# Altium footprint library CONNECTOR.PcbLib: 169 footprints (part 10 of 11)
Each footprint in its own frame and in the unit in brackets; x right, y up, seen from the top. Pads: shape width x height; smd on the part's side, far side on the other; paste and mask are expansions set on the pad; w line width, h text height; cw(c..) or ccw(c..) is an arc to the next point about the centre after c.
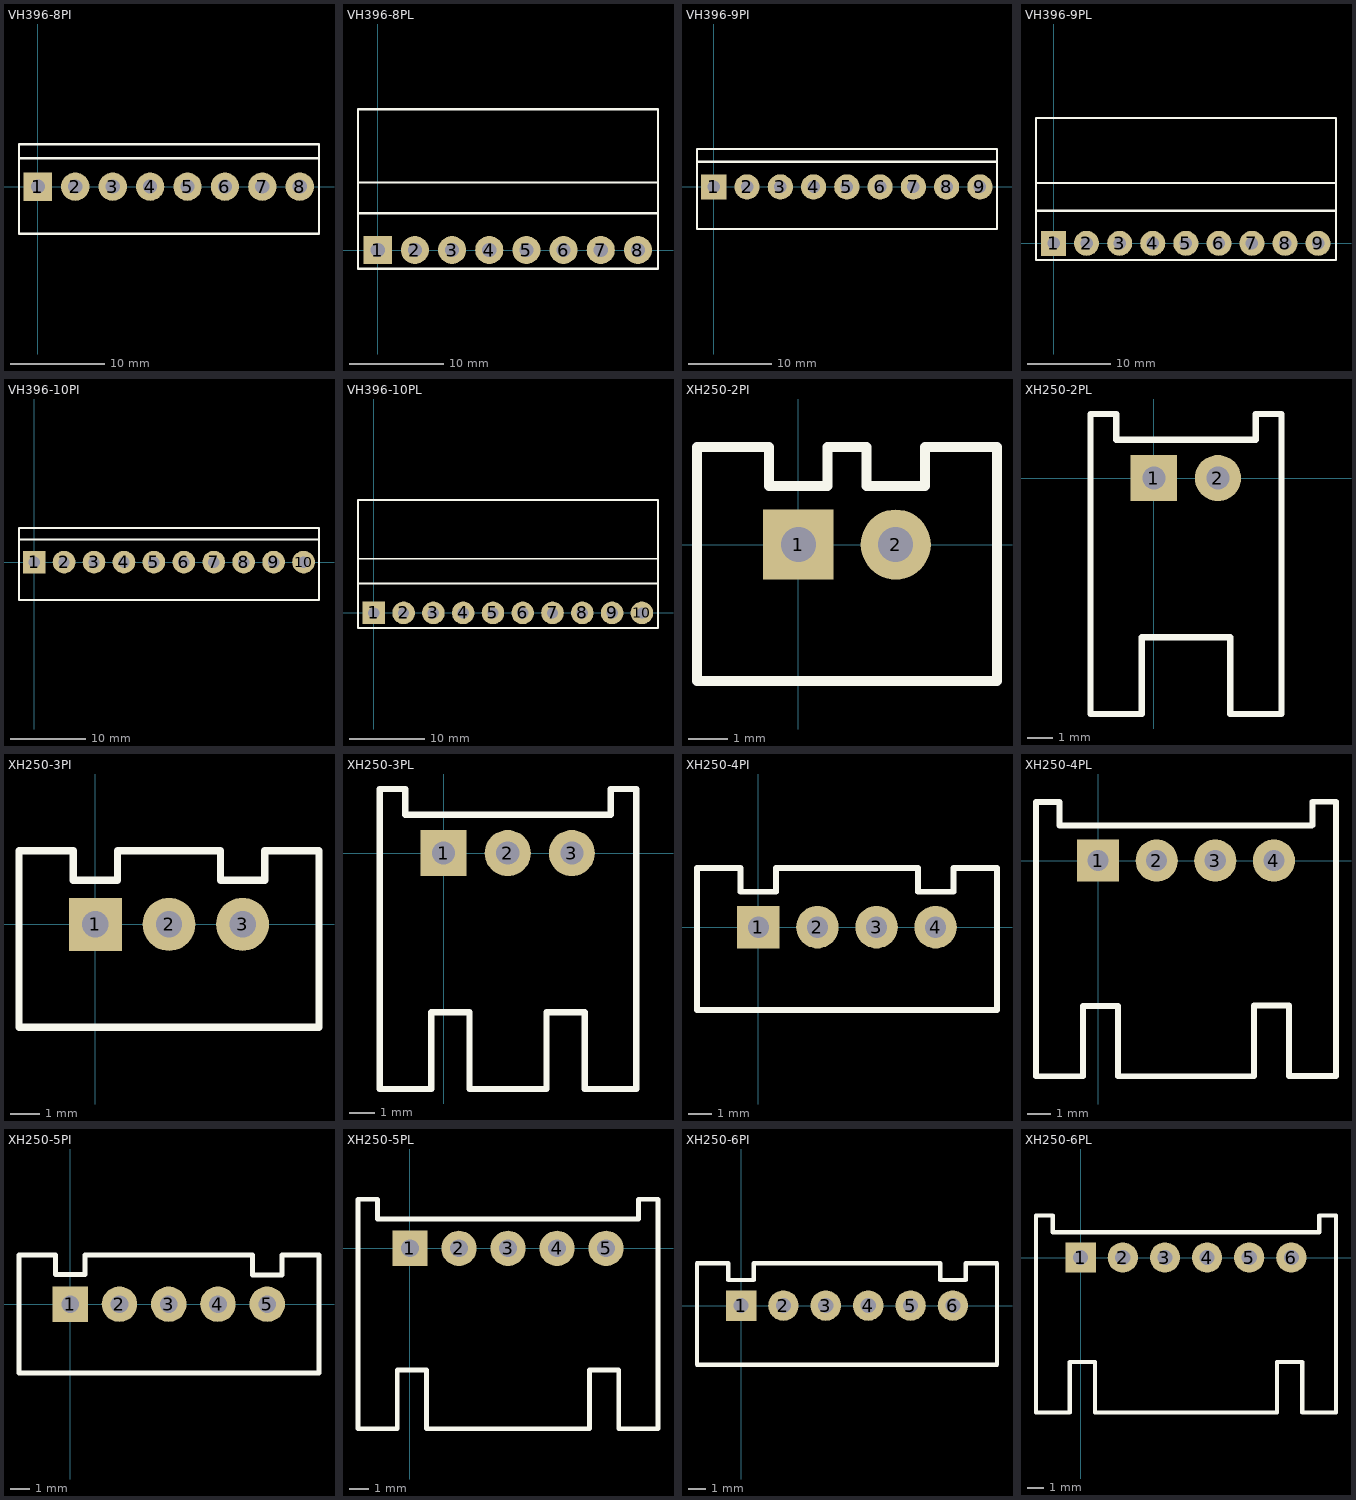
[diagram p9: the footprints below, top view; thin cyan lines are the x and y axes]

## VH396-8PI [mm]
height 11
pads (8):
  rect 3x3 hole 1.5: 1(0,0)
  round 3 hole 1.5: 2(3.96,0) 3(7.92,0) 4(11.88,0) 5(15.84,0) 6(19.8,0) 7(23.76,0) 8(27.72,0)
Top Overlay:
  lines w0.25: -2,3 -2,4.5 29.76,4.5 29.76,3 ; -2,3 -2,-5 29.76,-5 29.76,3 ; -2,3 29.76,3
3D body "VH3.96-2P.STEP": height 11.2, standoff -3.5, extent -1.882,-5.038 5.918,4.047

## VH396-8PL [mm]
pads (8):
  rect 3x3 hole 1.5: 1(0,0)
  round 3 hole 1.5: 2(3.96,0) 3(7.92,0) 4(11.88,0) 5(15.84,0) 6(19.8,0) 7(23.76,0) 8(27.72,0)
Top Overlay:
  lines w0.25: -2.1,3.9 29.86,3.9 ; -2.1,7.2 29.86,7.2 ; 29.86,3.9 29.86,-2 -2.1,-2 -2.1,15 29.86,15 29.86,7.2 ; 29.86,3.9 29.86,7.2

## VH396-9PI [mm]
height 11
pads (9):
  rect 3x3 hole 1.5: 1(0,0)
  round 3 hole 1.5: 2(3.96,0) 3(7.92,0) 4(11.88,0) 5(15.84,0) 6(19.8,0) 7(23.76,0) 8(27.72,0) 9(31.68,0)
Top Overlay:
  lines w0.25: -2,3 33.72,3 ; -2,3 -2,-5 33.72,-5 33.72,3 ; -2,3 -2,4.5 33.72,4.5 33.72,3
3D body "VH3.96-2P.STEP": height 11.2, standoff -3.5, extent -1.882,-5.038 5.918,4.047

## VH396-9PL [mm]
pads (9):
  rect 3x3 hole 1.5: 1(0,0)
  round 3 hole 1.5: 2(3.96,0) 3(7.92,0) 4(11.88,0) 5(15.84,0) 6(19.8,0) 7(23.76,0) 8(27.72,0) 9(31.68,0)
Top Overlay:
  lines w0.25: -2.1,3.9 33.82,3.9 ; -2.1,7.2 33.82,7.2 ; 33.82,3.9 33.82,7.2 ; 33.82,3.9 33.82,-2 -2.1,-2 -2.1,15 33.82,15 33.82,7.2

## VH396-10PI [mm]
height 11
pads (10):
  rect 3x3 hole 1.5: 1(0,0)
  round 3 hole 1.5: 2(3.96,0) 3(7.92,0) 4(11.88,0) 5(15.84,0) 6(19.8,0) 7(23.76,0) 8(27.72,0) 9(31.68,0) 10(35.64,0)
Top Overlay:
  lines w0.25: -2,3 37.68,3 ; -2,3 -2,-5 37.68,-5 37.68,3 ; -2,3 -2,4.5 37.68,4.5 37.68,3
3D body "VH3.96-2P.STEP": height 11.2, standoff -3.5, extent -1.882,-5.038 5.918,4.047

## VH396-10PL [mm]
pads (10):
  rect 3x3 hole 1.5: 1(0,0)
  round 3 hole 1.5: 2(3.96,0) 3(7.92,0) 4(11.88,0) 5(15.84,0) 6(19.8,0) 7(23.76,0) 8(27.72,0) 9(31.68,0) 10(35.64,0)
Top Overlay:
  lines w0.25: -2.1,3.9 37.78,3.9 ; -2.1,7.2 37.78,7.2 ; 37.78,3.9 37.78,-2 -2.1,-2 -2.1,15 37.78,15 37.78,7.2 ; 37.78,3.9 37.78,7.2

## XH250-2PI [mm]
height 7
pads (2):
  rect 1.8x1.8 hole 0.9: 1(0,0)
  round 1.8 hole 0.9: 2(2.5,0)
Top Overlay:
  lines w0.25: -2.6,2.5 -2.6,-3.5 5.1,-3.5 5.1,2.5 ; -2.6,2.5 -0.75,2.5 -0.75,1.5 0.75,1.5 0.75,2.5 1.75,2.5 1.75,1.5 3.25,1.5 3.25,2.5 5.1,2.5
3D body "B2B-XH-A.STEP": height 7, standoff -3.4, extent -2.45,-3.4 4.95,2.35

## XH250-2PL [mm]
pads (2):
  rect 1.8x1.8 hole 0.9: 1(0,0)
  round 1.8 hole 0.9: 2(2.5,0)
Top Overlay:
  lines w0.25: -2.47,-9.2 -0.47,-9.2 -0.47,-6.2 2.98,-6.2 2.98,-9.2 4.98,-9.2 4.98,2.5 3.98,2.5 3.98,1.5 -1.47,1.5 -1.47,2.5 -2.47,2.5 -2.47,-9.2
3D body "SW3dPS-S XH-A.STEP": height 6.1, standoff -2, extent -2.408,-9.231 4.992,2.269

## XH250-3PI [mm]
height 7
pads (3):
  rect 1.8x1.8 hole 0.9: 1(0,0)
  round 1.8 hole 0.9: 2(2.5,0) 3(5,0)
Top Overlay:
  lines w0.25: -2.6,2.5 -2.6,-3.5 7.6,-3.5 7.6,2.5 5.75,2.5 5.75,1.5 4.25,1.5 4.25,2.5 0.75,2.5 0.75,1.5 -0.75,1.5 -0.75,2.5 -2.6,2.5
3D body "B3B-XH-A.STEP": height 7, standoff -3.4, extent -2.45,-3.4 7.45,2.35

## XH250-3PL [mm]
pads (3):
  rect 1.8x1.8 hole 0.9: 1(0,0)
  round 1.8 hole 0.9: 2(2.5,0) 3(5,0)
Top Overlay:
  lines w0.25: -2.49,-9.2 -0.49,-9.2 -0.49,-6.2 1.01,-6.2 1.01,-9.2 4.01,-9.2 4.01,-6.2 5.51,-6.2 5.51,-9.2 7.51,-9.2 7.51,2.5 6.51,2.5 6.51,1.5 -1.49,1.5 -1.49,2.5 -2.49,2.5 -2.49,-9.2
3D body "SW3dPS-S XH-A.STEP": height 6.1, standoff -2, extent -2.489,-9.169 7.411,2.331

## XH250-4PI [mm]
height 7
pads (4):
  rect 1.8x1.8 hole 0.9: 1(0,0)
  round 1.8 hole 0.9: 2(2.5,0) 3(5,0) 4(7.5,0)
Top Overlay:
  lines w0.25: -2.6,2.5 -2.6,-3.5 10.1,-3.5 10.1,2.5 8.25,2.5 8.25,1.5 6.75,1.5 6.75,2.5 0.75,2.5 0.75,1.5 -0.75,1.5 -0.75,2.5 -2.6,2.5
3D body "B4B-XH-A.STEP": height 7, standoff -3.4, extent -2.45,-3.4 9.95,2.35

## XH250-4PL [mm]
pads (4):
  rect 1.8x1.8 hole 0.9: 1(0,0)
  round 1.8 hole 0.9: 2(2.5,0) 3(5,0) 4(7.5,0)
Top Overlay:
  lines w0.25: 6.641,-9.2 0.85,-9.2 0.85,-6.2 -0.65,-6.2 -0.65,-9.2 -2.65,-9.2 -2.65,2.5 -1.65,2.5 -1.65,1.5 9.117,1.5 ; 6.652,-9.19 6.652,-6.19 8.152,-6.19 8.152,-9.19 10.152,-9.19 10.152,2.51 9.152,2.51 9.152,1.51
3D body "SW3dPS-S XH-4A.STEP": height 6.1, standoff -2, extent -2.489,-9.231 9.911,2.269

## XH250-5PI [mm]
pads (5):
  rect 1.8x1.8 hole 0.9: 1(0,0)
  round 1.8 hole 0.9: 2(2.5,0) 3(5,0) 4(7.5,0) 5(10,0)
Top Overlay:
  lines w0.25: -2.6,2.5 -2.6,-3.5 12.63,-3.5 12.63,2.49 ; -2.6,2.5 -0.75,2.5 -0.75,1.5 0.75,1.5 0.75,2.5 9.26,2.5 ; 9.26,2.49 9.26,1.49 10.76,1.49 10.76,2.49 ; 10.76,2.5 12.61,2.5
  lines w0.254: -2.6,0 -2.6,0.03
3D body "User Library-JST B5B-XH-A.STEP": height 7, standoff -3.4, extent -2.44,-3.34 12.46,2.41

## XH250-5PL [mm]
pads (5):
  rect 1.8x1.8 hole 0.9: 1(0,0)
  round 1.8 hole 0.9: 2(2.5,0) 3(5,0) 4(7.5,0) 5(10,0)
Top Overlay:
  lines w0.25: 9.143,-9.2 0.85,-9.2 0.85,-6.2 -0.65,-6.2 -0.65,-9.2 -2.65,-9.2 -2.65,2.5 -1.65,2.5 -1.65,1.5 11.636,1.5 ; 9.15,-9.2 9.15,-6.2 10.65,-6.2 10.65,-9.2 12.65,-9.2 12.65,2.5 11.65,2.5 11.65,1.5
3D body "SW3dPS-S XH-A.STEP": height 6.1, standoff -2, extent -2.414,-9.212 12.486,2.288

## XH250-6PI [mm]
height 7
pads (6):
  rect 1.8x1.8 hole 0.9: 1(0,0)
  round 1.8 hole 0.9: 2(2.5,0) 3(5,0) 4(7.5,0) 5(10,0) 6(12.5,0)
Top Overlay:
  lines w0.25: -2.6,2.5 -2.6,-3.5 15.1,-3.5 15.1,2.5 ; -2.6,2.5 -0.75,2.5 -0.75,1.5 0.75,1.5 0.75,2.5 11.73,2.5 ; 11.75,2.5 11.75,1.5 13.25,1.5 13.25,2.5 15.1,2.5
3D body "B6B-XH-A.STEP": height 7, standoff -3.4, extent -2.45,-3.38 14.95,2.37

## XH250-6PL [mm]
pads (6):
  rect 1.8x1.8 hole 0.9: 1(0,0)
  round 1.8 hole 0.9: 2(2.5,0) 3(5,0) 4(7.5,0) 5(10,0) 6(12.5,0)
Top Overlay:
  lines w0.25: -2.65,-9.2 -0.65,-9.2 -0.65,-6.2 0.85,-6.2 0.85,-9.2 11.65,-9.2 11.65,-6.2 13.15,-6.2 13.15,-9.2 15.15,-9.2 15.15,2.5 14.15,2.5 14.15,1.5 -1.65,1.5 -1.65,2.5 -2.65,2.5 -2.65,-9.2